# Altium footprint library PcbLib1.PcbLib: 148 footprints (part 10 of 10)
Each footprint in its own frame and in the unit in brackets; x right, y up, seen from the top. Pads: shape width x height; smd on the part's side, far side on the other; paste and mask are expansions set on the pad; w line width, h text height; cw(c..) or ccw(c..) is an arc to the next point about the centre after c.
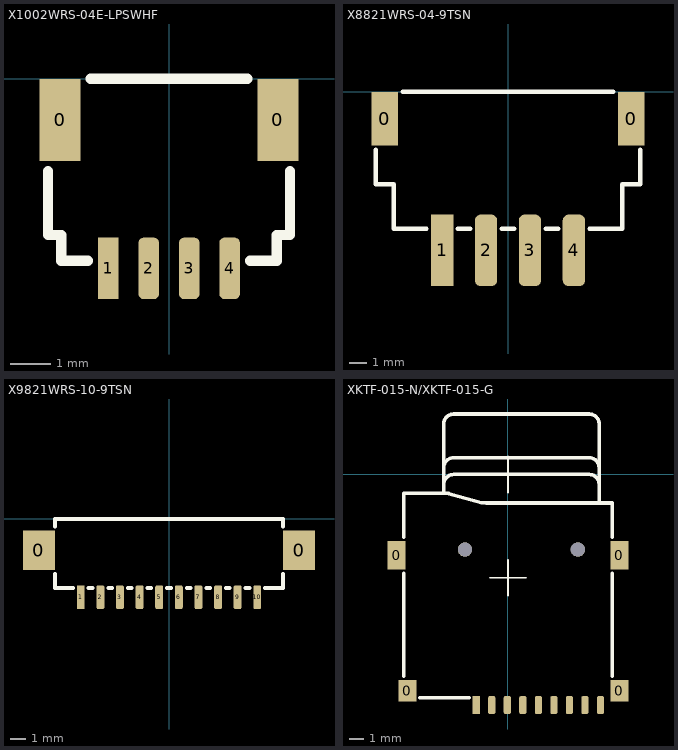
[diagram p9: the footprints below, top view; thin cyan lines are the x and y axes]

## X1002WRS-04E-LPSWHF [mil]
pads (6):
  rect 40x80 smd: 0(-106.3,-40) 0(106.3,-40)
  rect 20x60 smd: 1(-59.06,-184.88)
  rrect50% 20x60 smd: 2(-19.69,-184.88) 3(19.68,-184.88) 4(59.05,-184.88)
Top Overlay:
  lines w10: -118.11,-90 -118.11,-152.32 -105.11,-152.32 -105.11,-177.32 ; -103.11,-177.32 -79.06,-177.32 ; -76.3,0 76.3,0 ; 79.06,-177.32 103.11,-177.32 ; 105.11,-177.32 105.11,-152.32 118.11,-152.32 118.11,-90
3D body "X1002WRS-04E-LPSWHF.stp": height 125.2, standoff -0.76, extent -120.06,-205.47 120.06,0

## X8821WRS-04-9TSN [mil] "XKB"
pads (6):
  rect 60x120 smd: 0(-276.18,-60) 0(276.18,-60)
  rect 50x160 smd: 1(-147.64,-355)
  rrect50% 50x160 smd: 2(-49.21,-355) 3(49.21,-355) 4(147.64,-355)
Top Overlay:
  lines w10: -296.18,-130 -296.18,-207.09 -256.18,-207.09 -256.18,-307.09 -182.64,-307.09 ; -236.18,0 236.18,0 ; -112.64,-307.09 -84.21,-307.09 ; -14.21,-307.09 14.21,-307.09 ; 84.21,-307.09 112.64,-307.09 ; 182.64,-307.09 256.18,-307.09 256.18,-207.09 296.18,-207.09 296.18,-130
3D body "X8821WRS-04-9TSN.stp": height 239.19, standoff 1, extent -295.28,-423.23 295.28,0

## X9821WRS-10-9TSN [mil] "XKB"
pads (12):
  rect 80x100 smd: 0(-326.42,-78.74) 0(326.42,-78.74)
  rect 20x60 smd: 1(-221.46,-196.69)
  rrect50% 20x60 smd: 2(-172.24,-196.69) 3(-123.03,-196.69) 4(-73.82,-196.69) 5(-24.61,-196.69) 6(24.61,-196.69) 7(73.82,-196.69) 8(123.03,-196.69) 9(172.24,-196.69) 10(221.46,-196.69)
Top Overlay:
  lines w10: -286.42,-138.74 -286.42,-173.23 -241.46,-173.23 ; -286.42,-18.74 -286.42,0 286.42,0 286.42,-18.74 ; -201.46,-173.23 -192.24,-173.23 ; -152.24,-173.23 -143.03,-173.23 ; -103.03,-173.23 -93.82,-173.23 ; -53.82,-173.23 -44.61,-173.23 ; -4.61,-173.23 4.61,-173.23 ; 44.61,-173.23 53.82,-173.23 ; 93.82,-173.23 103.03,-173.23 ; 143.03,-173.23 152.24,-173.23 ; 192.24,-173.23 201.46,-173.23 ; 241.46,-173.23 286.42,-173.23 286.42,-138.74
3D body "X9821WRS-10-9TSN.stp": height 145.67, standoff 0, extent -347.64,-206.69 347.64,0

## XKTF-015-N/XKTF-015-G [mil] "TF Memory Card Connector"
pads (15):
  rect 50x80 smd: 0(-310.35,-225.2) 0(310.35,-225.2)
  rect 50x60 smd: 0(-280.35,-603.15) 0(310.35,-603.15)
  rect 20x50 smd: 1(-88.58,-642.83)
  rrect50% 20x50 smd: 2(-45.27,-642.83) 3(-1.97,-642.83) 4(41.34,-642.83) 5(84.65,-642.83) 6(127.95,-642.83) 7(171.26,-642.83) 8(214.57,-642.83) 9(257.87,-642.83)
  round 40 hole 40 unplated: ""(-120.08,-209.45) ""(194.88,-209.45)
Top Overlay:
  lines w5: -50,-288.19 50,-288.19 ; 0,-338.19 0,-238.19 ; 0,-50 0,50
  lines w10: -290.35,-563.15 -290.35,-275.2 ; -290.35,-175.2 -290.35,-51.97 -179.13,-51.97 ; -245.35,-622.83 -108.58,-622.83 ; -179.13,-27.56 cw(c-151.57,-27.56) -151.57,0 226.38,0 cw(c226.38,-27.56) 253.94,-27.56 ; -179.13,18.9 cw(c-151.57,18.9) -151.57,46.46 226.38,46.46 cw(c226.38,18.9) 253.94,18.9 ; 253.94,-79.53 253.94,140.94 ccw(c226.38,140.94) 226.38,168.5 -151.57,168.5 ccw(c-151.57,140.94) -179.13,140.94 -179.13,-51.97 ; 290.35,-563.15 290.35,-275.2 ; 290.35,-175.2 290.35,-79.53 -60.15,-79.53 cw(c-60.15,-0.8) -73.82,-78.35 -165.46,-53.16 ccw(c-179.13,-130.71) -179.13,-51.97
3D body "XKTF-015-X.stp": height 80.74, standoff -21.62, extent -318.5,-651.14 318.5,43.76